# Altium footprint library Test.PcbLib: 245 footprints (part 16 of 17)
Each footprint in its own frame and in the unit in brackets; x right, y up, seen from the top. Pads: shape width x height; smd on the part's side, far side on the other; paste and mask are expansions set on the pad; w line width, h text height; cw(c..) or ccw(c..) is an arc to the next point about the centre after c.
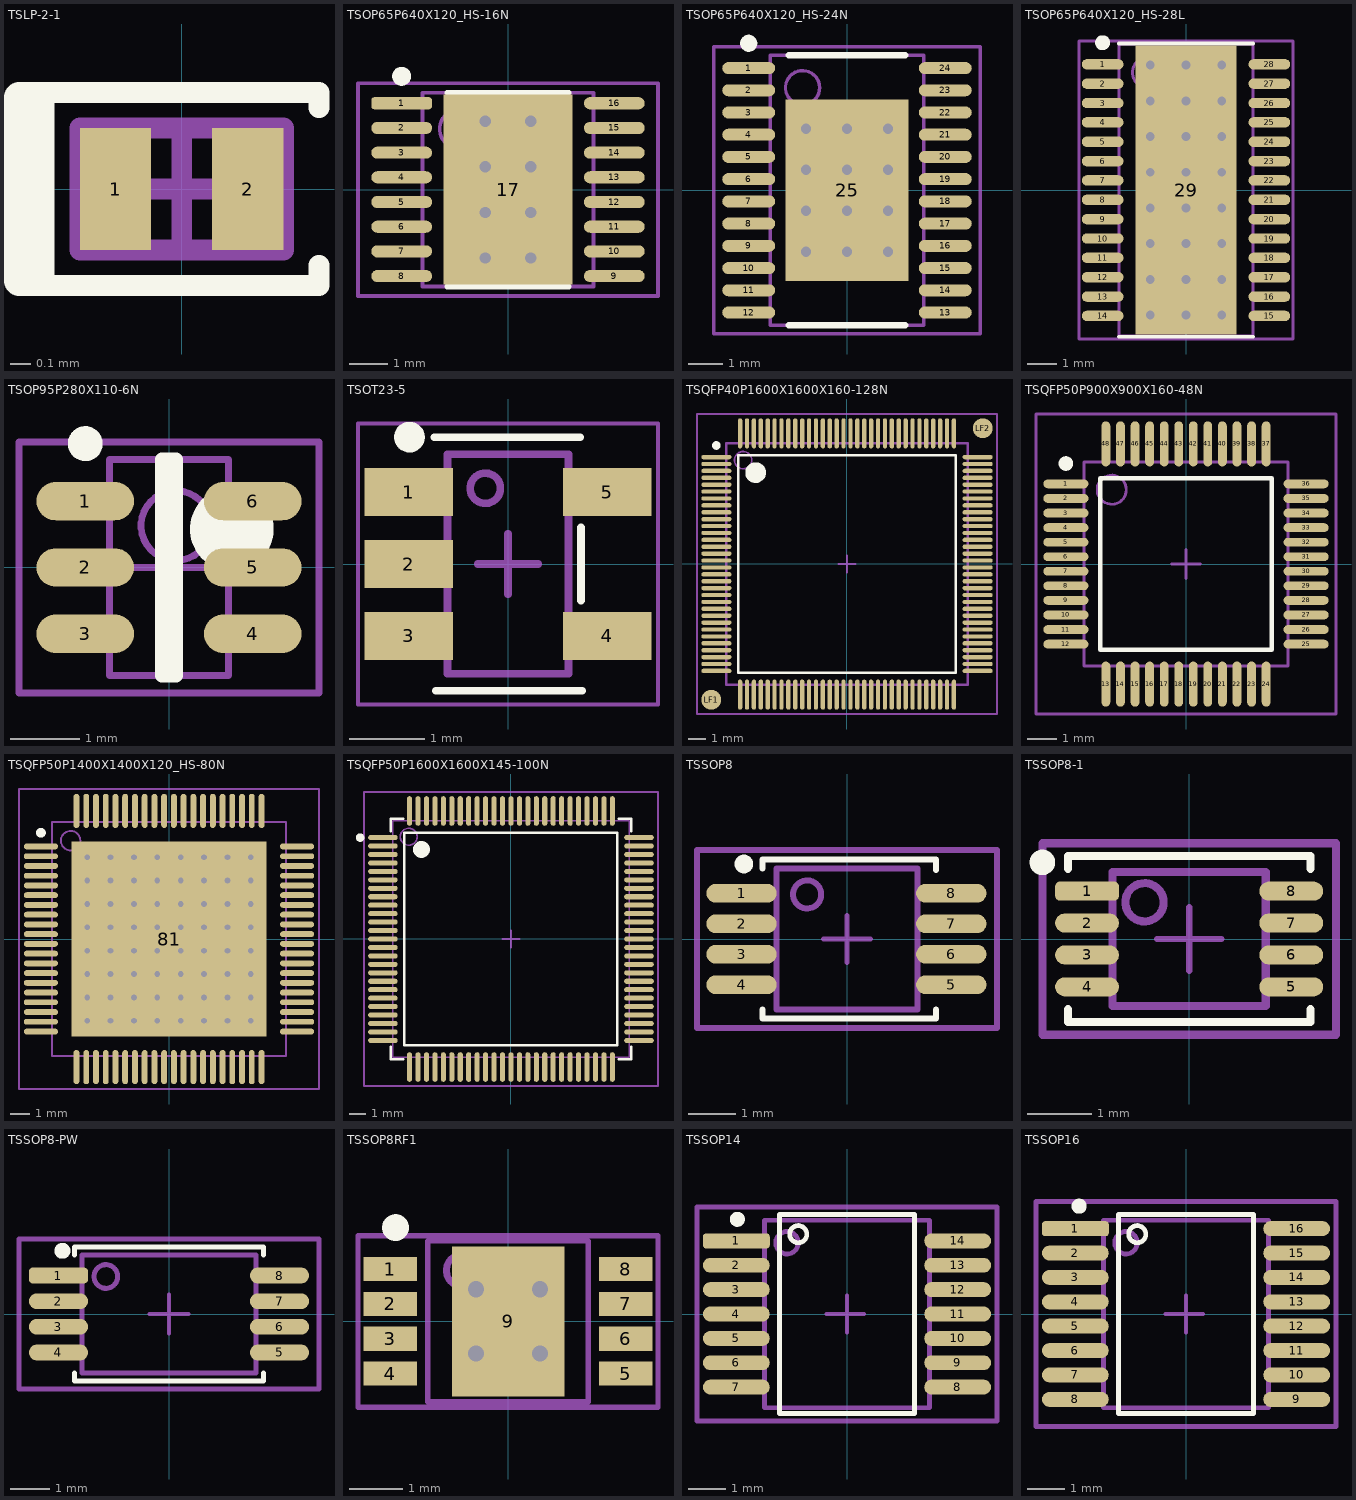
[diagram p15: the footprints below, top view; thin cyan lines are the x and y axes]

## TSLP-2-1 [mm] "TSLP-2-1 diode"
height 0.4
pads (2):
  rect 0.35x0.6 smd: 1(-0.325,0) 2(0.325,0)
Top Overlay:
  lines w0.102: -0.8,-0.475 -0.7,-0.475 0.675,-0.475 0.675,-0.375 ; -0.8,0.475 -0.7,0.475 0.675,0.475 0.675,0.4
  lines w0.15: -0.8,-0.45 -0.8,0.45 ; -0.7,-0.45 -0.7,0.45
Mechanical 13:
  lines w0.102: -0.5,-0.3 -0.5,0.3 ; -0.5,-0.3 -0.5,0.3 ; -0.5,-0.3 0.5,-0.3 0.5,0.3 -0.5,0.3
Mechanical 15:
  lines w0.102: -0.3,0 0.3,0 ; 0,-0.3 0,0.3
3D body: height 0.41, standoff 0.4, extent -0.525,-0.3 -0.325,0.3
3D body: height 0.4, standoff 0, extent -0.525,-0.3 0.5,0.3

## TSOP65P640X120_HS-16N [mm] "TSOP, 16-Leads, Body 5,1x4,5mm (max), Pitch 0,65mm, IPC Medium Density"
height 1.2
pads (17):
  rrect50% 1.6x0.32 smd mask+0.051: 1(-2.8,2.275)
  oval 1.6x0.32 smd mask+0.051: 2(-2.8,1.625) 3(-2.8,0.975) 4(-2.8,0.325) 5(-2.8,-0.325) 6(-2.8,-0.975) 7(-2.8,-1.625) 8(-2.8,-2.275) 9(2.8,-2.275) 10(2.8,-1.625) 11(2.8,-0.975) 12(2.8,-0.325) 13(2.8,0.325) 14(2.8,0.975) 15(2.8,1.625) 16(2.8,2.275)
  rect 3.4x5 smd paste-5 mask-5: 17(0,0)
via -0.6,0.6 diameter 0.65 hole 0.3
via 0.6,0.6 diameter 0.65 hole 0.3
via -0.6,-0.6 diameter 0.65 hole 0.3
via 0.6,-0.6 diameter 0.65 hole 0.3
via -0.6,-1.8 diameter 0.65 hole 0.3
via 0.6,-1.8 diameter 0.65 hole 0.3
via 0.6,1.8 diameter 0.65 hole 0.3
via -0.6,1.8 diameter 0.65 hole 0.3
Top Overlay:
  circle w0.25: c-2.8,2.985 r0.125
  lines w0.15: -1.6,-2.55 1.6,-2.55 ; -1.6,2.55 1.6,2.55
Top Paste:
  region: -0.925,-1.95 -0.75,-2.125 -0.75,-2.45 -1.65,-2.45 -1.65,-1.95
  region: 0.925,-1.95 0.75,-2.125 0.75,-2.45 1.65,-2.45 1.65,-1.95
  region: 0.925,1.95 0.75,2.125 0.75,2.45 1.65,2.45 1.65,1.95
  region: -0.45,-2.125 -0.275,-1.95 0.275,-1.95 0.45,-2.125 0.45,-2.45 -0.45,-2.45
  region: -0.45,2.125 -0.275,1.95 0.275,1.95 0.45,2.125 0.45,2.45 -0.45,2.45
  region: 0.925,1.65 0.75,1.475 0.75,0.925 0.925,0.75 1.65,0.75 1.65,1.65
  region: 0.925,0.45 0.75,0.275 0.75,-0.275 0.925,-0.45 1.65,-0.45 1.65,0.45
  region: 0.925,-0.75 0.75,-0.925 0.75,-1.475 0.925,-1.65 1.65,-1.65 1.65,-0.75
  region: -0.925,-0.75 -0.75,-0.925 -0.75,-1.475 -0.925,-1.65 -1.65,-1.65 -1.65,-0.75
  region: -0.925,0.45 -0.75,0.275 -0.75,-0.275 -0.925,-0.45 -1.65,-0.45 -1.65,0.45
  region: -0.45,-0.925 -0.275,-0.75 0.275,-0.75 0.45,-0.925 0.45,-1.475 0.275,-1.65 -0.275,-1.65 -0.45,-1.475
  region: -0.45,0.275 -0.275,0.45 0.275,0.45 0.45,0.275 0.45,-0.275 0.275,-0.45 -0.275,-0.45 -0.45,-0.275
  region: -0.45,1.475 -0.275,1.65 0.275,1.65 0.45,1.475 0.45,0.925 0.275,0.75 -0.275,0.75 -0.45,0.925
  region: -0.925,1.65 -0.75,1.475 -0.75,0.925 -0.925,0.75 -1.65,0.75 -1.65,1.65
  region: -0.925,1.95 -0.75,2.125 -0.75,2.45 -1.65,2.45 -1.65,1.95
Top Solder:
  drawing of 8 lines, arcs and shapes, not listed
Mechanical 13:
  circle w0.1: c-1.3,1.6 r0.5
  lines w0.1: -2.25,-2.55 -2.25,2.55 2.25,2.55 2.25,-2.55 -2.25,-2.55
Mechanical 15:
  lines w0.1: -0.5,0 0.5,0 ; 0,-0.5 0,0.5 ; -3.95,-2.8 -3.95,2.8 3.95,2.8 3.95,-2.8 -3.95,-2.8
3D body: height 1.2, standoff 0.05, extent -2.25,-2.55 2.25,2.55

## TSOP65P640X120_HS-24N [mm] "TSOP, 24-Leads, Body 7,9x4,5mm (max), Pitch 0,65mm, IPC Medium Density"
height 1.2
pads (25):
  oval 1.55x0.35 smd mask+0.051: 1(-2.875,3.575) 2(-2.875,2.925) 3(-2.875,2.275) 4(-2.875,1.625) 5(-2.875,0.975) 6(-2.875,0.325) 7(-2.875,-0.325) 8(-2.875,-0.975) 9(-2.875,-1.625) 10(-2.875,-2.275) 11(-2.875,-2.925) 12(-2.875,-3.575) 13(2.875,-3.575) 14(2.875,-2.925) 15(2.875,-2.275) 16(2.875,-1.625) 17(2.875,-0.975) 18(2.875,-0.325) 19(2.875,0.325) 20(2.875,0.975) 21(2.875,1.625) 22(2.875,2.275) 23(2.875,2.925) 24(2.875,3.575)
  rect 3.6x5.3 smd paste-7 mask-7: 25(0,0)
via -1.2,1.8 diameter 0.65 hole 0.3
via 0,1.8 diameter 0.65 hole 0.3
via 1.2,1.8 diameter 0.65 hole 0.3
via -1.2,0.6 diameter 0.65 hole 0.3
via 0,0.6 diameter 0.65 hole 0.3
via 1.2,0.6 diameter 0.65 hole 0.3
via -1.2,-0.6 diameter 0.65 hole 0.3
via 0,-0.6 diameter 0.65 hole 0.3
via 1.2,-0.6 diameter 0.65 hole 0.3
via -1.2,-1.8 diameter 0.65 hole 0.3
via 0,-1.8 diameter 0.65 hole 0.3
via 1.2,-1.8 diameter 0.65 hole 0.3
Top Overlay:
  circle w0.25: c-2.875,4.3 r0.125
  lines w0.2: -1.7,-3.95 1.7,-3.95 ; -1.7,3.95 1.7,3.95
Top Paste:
  region: -1.525,-1.95 -1.35,-2.125 -1.35,-2.625 -1.775,-2.625 -1.775,-1.95
  region: 1.525,-1.95 1.35,-2.125 1.35,-2.625 1.775,-2.625 1.775,-1.95
  region: 1.525,1.95 1.35,2.125 1.35,2.625 1.775,2.625 1.775,1.95
  region: -1.525,1.95 -1.35,2.125 -1.35,2.625 -1.775,2.625 -1.775,1.95
  region: -1.092,2.625 -1.092,2.159 -0.813,1.88 -0.406,1.88 -0.127,2.159 -0.127,2.625
  region: 0.108,2.625 0.108,2.159 0.387,1.88 0.794,1.88 1.073,2.159 1.073,2.625
  region: -1.092,-2.625 -1.092,-2.159 -0.813,-1.88 -0.406,-1.88 -0.127,-2.159 -0.127,-2.625
  region: 0.108,-2.625 0.108,-2.159 0.387,-1.88 0.794,-1.88 1.073,-2.159 1.073,-2.625
  region: 1.775,0.708 1.559,0.708 1.28,0.987 1.28,1.394 1.559,1.673 1.775,1.673
  region: 1.775,-0.492 1.559,-0.492 1.28,-0.213 1.28,0.194 1.559,0.473 1.775,0.473
  region: 1.775,-1.692 1.559,-1.692 1.28,-1.413 1.28,-1.006 1.559,-0.727 1.775,-0.727
  region: -1.775,-1.692 -1.559,-1.692 -1.28,-1.413 -1.28,-1.006 -1.559,-0.727 -1.775,-0.727
  region: -1.775,-0.492 -1.559,-0.492 -1.28,-0.213 -1.28,0.194 -1.559,0.473 -1.775,0.473
  region: -1.775,0.708 -1.559,0.708 -1.28,0.987 -1.28,1.394 -1.559,1.673 -1.775,1.673
  region: -1.067,1.448 -0.864,1.651 -0.356,1.651 -0.152,1.448 -0.152,0.94 -0.356,0.737 -0.838,0.737 -1.067,0.965
  region: 0.133,1.448 0.336,1.651 0.844,1.651 1.048,1.448 1.048,0.94 0.844,0.737 0.362,0.737 0.133,0.965
  region: 0.133,0.248 0.336,0.451 0.844,0.451 1.048,0.248 1.048,-0.26 0.844,-0.463 0.362,-0.463 0.133,-0.235
  region: 0.133,-0.952 0.336,-0.749 0.844,-0.749 1.048,-0.952 1.048,-1.46 0.844,-1.663 0.362,-1.663 0.133,-1.435
  region: -1.067,-0.952 -0.864,-0.749 -0.356,-0.749 -0.152,-0.952 -0.152,-1.46 -0.356,-1.663 -0.838,-1.663 -1.067,-1.435
  region: -1.067,0.248 -0.864,0.451 -0.356,0.451 -0.152,0.248 -0.152,-0.26 -0.356,-0.463 -0.838,-0.463 -1.067,-0.235
Top Solder:
  drawing of 24 lines, arcs and shapes, not listed
Mechanical 13:
  circle w0.1: c-1.3,3 r0.5
  lines w0.1: -2.25,-3.95 -2.25,3.95 2.25,3.95 2.25,-3.95 -2.25,-3.95
Mechanical 15:
  lines w0.1: -0.5,0 0.5,0 ; 0,-0.5 0,0.5 ; -3.9,-4.2 -3.9,4.2 3.9,4.2 3.9,-4.2 -3.9,-4.2
3D body: height 1.2, standoff 0.05, extent -2.25,-3.95 2.25,3.95
3D body: height 1.2, standoff 0, extent -1.803,2.515 -0.807,3.513

## TSOP65P640X120_HS-28L [mm] "TSOP, 28-Leads, Body 9,8x4,5mm, Pitch 0,65mm, IPC High Density"
height 1.2
pads (29):
  oval 1.4x0.35 smd mask+0.051: 1(-2.8,4.225) 2(-2.8,3.575) 3(-2.8,2.925) 4(-2.8,2.275) 5(-2.8,1.625) 6(-2.8,0.975) 7(-2.8,0.325) 8(-2.8,-0.325) 9(-2.8,-0.975) 10(-2.8,-1.625) 11(-2.8,-2.275) 12(-2.8,-2.925) 13(-2.8,-3.575) 14(-2.8,-4.225) 15(2.8,-4.225) 16(2.8,-3.575) 17(2.8,-2.925) 18(2.8,-2.275) 19(2.8,-1.625) 20(2.8,-0.975) 21(2.8,-0.325) 22(2.8,0.325) 23(2.8,0.975) 24(2.8,1.625) 25(2.8,2.275) 26(2.8,2.925) 27(2.8,3.575) 28(2.8,4.225)
  rect 3.4x9.7 smd paste-5 mask-5: 29(0,0)
via -1.2,4.2 diameter 0.65 hole 0.3
via 0,4.2 diameter 0.65 hole 0.3
via 1.2,4.2 diameter 0.65 hole 0.3
via -1.2,3 diameter 0.65 hole 0.3
via 0,3 diameter 0.65 hole 0.3
via 1.2,3 diameter 0.65 hole 0.3
via -1.2,1.8 diameter 0.65 hole 0.3
via 0,1.8 diameter 0.65 hole 0.3
via 1.2,1.8 diameter 0.65 hole 0.3
via -1.2,0.6 diameter 0.65 hole 0.3
via 0,0.6 diameter 0.65 hole 0.3
via 1.2,0.6 diameter 0.65 hole 0.3
via -1.2,-0.6 diameter 0.65 hole 0.3
via 0,-0.6 diameter 0.65 hole 0.3
via 1.2,-0.6 diameter 0.65 hole 0.3
via -1.2,-1.8 diameter 0.65 hole 0.3
via 0,-1.8 diameter 0.65 hole 0.3
via 1.2,-1.8 diameter 0.65 hole 0.3
via -1.2,-3 diameter 0.65 hole 0.3
via 0,-3 diameter 0.65 hole 0.3
via 1.2,-3 diameter 0.65 hole 0.3
via -1.2,-4.2 diameter 0.65 hole 0.3
via 0,-4.2 diameter 0.65 hole 0.3
via 1.2,-4.2 diameter 0.65 hole 0.3
Top Overlay:
  circle w0.25: c-2.8,4.95 r0.125
  lines w0.127: -2.25,-4.925 2.25,-4.925 ; -2.25,4.925 2.25,4.925
Top Paste:
  drawing of 36 lines, arcs and shapes, not listed
Top Solder:
  drawing of 24 lines, arcs and shapes, not listed
Mechanical 12:
  circle w0.4: c-1.2,4.2 r0.15
  circle w0.4: c-1.2,3 r0.15
  circle w0.4: c-1.2,1.8 r0.15
  circle w0.4: c-1.2,0.6 r0.15
  circle w0.4: c-1.2,-0.6 r0.15
  circle w0.4: c-1.2,-1.8 r0.15
  circle w0.4: c-1.2,-3 r0.15
  circle w0.4: c-1.2,-4.2 r0.15
  circle w0.4: c0,-4.2 r0.15
  circle w0.4: c1.2,-4.2 r0.15
  circle w0.4: c1.2,-3 r0.15
  circle w0.4: c1.2,-1.8 r0.15
  circle w0.4: c1.2,-0.6 r0.15
  circle w0.4: c1.2,0.6 r0.15
  circle w0.4: c1.2,1.8 r0.15
  circle w0.4: c1.2,3 r0.15
  circle w0.4: c1.2,4.2 r0.15
  circle w0.4: c0,4.2 r0.15
  circle w0.4: c0,3 r0.15
  circle w0.4: c0,1.8 r0.15
  circle w0.4: c0,0.6 r0.15
  circle w0.4: c0,-0.6 r0.15
  circle w0.4: c0,-1.8 r0.15
  circle w0.4: c0,-3 r0.15
Mechanical 13:
  circle w0.1: c-1.3,3.95 r0.5
  lines w0.1: -2.25,-4.9 -2.25,4.9 2.25,4.9 2.25,-4.9 -2.25,-4.9
Mechanical 15:
  lines w0.1: -0.5,0 0.5,0 ; 0,-0.5 0,0.5 ; -3.6,-5 -3.6,5 3.6,5 3.6,-5 -3.6,-5
3D body: height 1.2, standoff 0.1, extent -2.25,-4.9 2.25,4.9
3D body: height 1.21, standoff 1.2, extent -1.8,3.45 -0.804,4.448

## TSOP95P280X110-6N [mm] "TSOP, 6-Leads, Body 3,1x1,7mm (max), Pitch 0,95mm, IPC Medium Density"
height 1.1
pads (6):
  oval 1.4x0.55 smd mask+0.051: 1(-1.2,0.95) 2(-1.2,0) 3(-1.2,-0.95) 4(1.2,-0.95) 5(1.2,0) 6(1.2,0.95)
Top Overlay:
  circle w0.6: c0.9,0.55 r0.3
  circle w0.25: c-1.2,1.775 r0.125
  lines w0.2: -0.1,-1.55 0.1,-1.55 0.1,1.55 -0.1,1.55 -0.1,-1.55
Mechanical 13:
  circle w0.1: c0.1,0.6 r0.5
  lines w0.1: -0.85,-1.55 0.85,-1.55 0.85,1.55 -0.85,1.55 -0.85,-1.55
Mechanical 15:
  lines w0.1: -0.5,0 0.5,0 ; 0,-0.5 0,0.5 ; -2.15,-1.8 2.15,-1.8 2.15,1.8 -2.15,1.8 -2.15,-1.8
3D body: height 1.1, standoff 0.01, extent -0.85,-1.55 0.85,1.55

## TSOT23-5 [mm] "5-LEAD plastic"
height 0.85
pads (5):
  rect 1.168x0.635 smd mask+0.051: 1(-1.31,0.95) 2(-1.31,0) 3(-1.31,-0.95) 4(1.31,-0.95) 5(1.31,0.95)
Top Overlay:
  circle w0.203: c-1.302,1.675 r0.102
  lines w0.102: -0.975,1.675 0.955,1.675 ; -0.95,-1.675 0.98,-1.675 ; 0.965,-0.483 0.965,0.483
Mechanical 13:
  circle w0.1: c-0.3,1 r0.2
  lines w0.102: -0.8,-1.45 -0.8,1.45 0.8,1.45 0.8,-1.45 -0.8,-1.45
Mechanical 15:
  lines w0.051: -1.981,-1.854 -1.981,1.854 1.981,1.854 1.981,-1.854 -1.981,-1.854
  lines w0.102: -0.4,0 0.4,0 ; 0,-0.4 0,0.4
3D body: height 1.46, standoff 1.45, extent -0.504,0.796 -0.096,1.204
3D body: height 1.45, standoff 0, extent -0.8,-1.45 0.8,1.45
3D body: height 0.3, standoff 0, extent -1.275,0.725 -0.8,1.175
3D body: height 0.3, standoff 0, extent -1.288,-1.175 -0.812,-0.725
3D body: height 0.3, standoff 0, extent -1.275,-0.225 -0.8,0.225
3D body: height 0.3, standoff 0, extent 0.812,0.725 1.288,1.175
3D body: height 0.3, standoff 0, extent 0.812,-1.175 1.288,-0.725

## TSQFP40P1600X1600X160-128N [mm] "TSQFP, 128-Leads, Body 16,2x16,2mm (max), Pitch 0,40mm, IPC Medium Density"
height 1.6
pads (130):
  oval 1.75x0.25 smd mask+0.051: 1(-7.575,6.2) 2(-7.575,5.8) 3(-7.575,5.4) 4(-7.575,5) 5(-7.575,4.6) 6(-7.575,4.2) 7(-7.575,3.8) 8(-7.575,3.4) 9(-7.575,3) 10(-7.575,2.6) 11(-7.575,2.2) 12(-7.575,1.8) 13(-7.575,1.4) 14(-7.575,1) 15(-7.575,0.6) 16(-7.575,0.2) 17(-7.575,-0.2) 18(-7.575,-0.6) 19(-7.575,-1) 20(-7.575,-1.4) 21(-7.575,-1.8) 22(-7.575,-2.2) 23(-7.575,-2.6) 24(-7.575,-3) 25(-7.575,-3.4) 26(-7.575,-3.8) 27(-7.575,-4.2) 28(-7.575,-4.6) 29(-7.575,-5) 30(-7.575,-5.4) 31(-7.575,-5.8) 32(-7.575,-6.2) 65(7.575,-6.2) 66(7.575,-5.8) 67(7.575,-5.4) 68(7.575,-5) 69(7.575,-4.6) 70(7.575,-4.2) 71(7.575,-3.8) 72(7.575,-3.4) 73(7.575,-3) 74(7.575,-2.6) 75(7.575,-2.2) 76(7.575,-1.8) 77(7.575,-1.4) 78(7.575,-1) 79(7.575,-0.6) 80(7.575,-0.2) 81(7.575,0.2) 82(7.575,0.6) 83(7.575,1) 84(7.575,1.4) 85(7.575,1.8) 86(7.575,2.2) 87(7.575,2.6) 88(7.575,3) 89(7.575,3.4) 90(7.575,3.8) 91(7.575,4.2) 92(7.575,4.6) 93(7.575,5) 94(7.575,5.4) 95(7.575,5.8) 96(7.575,6.2)
  oval 0.25x1.75 smd mask+0.051: 33(-6.2,-7.575) 34(-5.8,-7.575) 35(-5.4,-7.575) 36(-5,-7.575) 37(-4.6,-7.575) 38(-4.2,-7.575) 39(-3.8,-7.575) 40(-3.4,-7.575) 41(-3,-7.575) 42(-2.6,-7.575) 43(-2.2,-7.575) 44(-1.8,-7.575) 45(-1.4,-7.575) 46(-1,-7.575) 47(-0.6,-7.575) 48(-0.2,-7.575) 49(0.2,-7.575) 50(0.6,-7.575) 51(1,-7.575) 52(1.4,-7.575) 53(1.8,-7.575) 54(2.2,-7.575) 55(2.6,-7.575) 56(3,-7.575) 57(3.4,-7.575) 58(3.8,-7.575) 59(4.2,-7.575) 60(4.6,-7.575) 61(5,-7.575) 62(5.4,-7.575) 63(5.8,-7.575) 64(6.2,-7.575) 97(6.2,7.575) 98(5.8,7.575) 99(5.4,7.575) 100(5,7.575) 101(4.6,7.575) 102(4.2,7.575) 103(3.8,7.575) 104(3.4,7.575) 105(3,7.575) 106(2.6,7.575) 107(2.2,7.575) 108(1.8,7.575) 109(1.4,7.575) 110(1,7.575) 111(0.6,7.575) 112(0.2,7.575) 113(-0.2,7.575) 114(-0.6,7.575) 115(-1,7.575) 116(-1.4,7.575) 117(-1.8,7.575) 118(-2.2,7.575) 119(-2.6,7.575) 120(-3,7.575) 121(-3.4,7.575) 122(-3.8,7.575) 123(-4.2,7.575) 124(-4.6,7.575) 125(-5,7.575) 126(-5.4,7.575) 127(-5.8,7.575) 128(-6.2,7.575)
  round 1.143 smd paste-1.27 mask+0.635: LF1(-7.874,-7.874) LF2(7.874,7.874)
Top Overlay:
  circle w0.25: c-7.575,6.875 r0.125
  circle w0.6: c-5.3,5.3 r0.3
  lines w0.15: -6.3,-6.3 -6.3,6.3 6.3,6.3 6.3,-6.3 -6.3,-6.3
Mechanical 13:
  circle w0.1: c-6.023,6.023 r0.5
  lines w0.127: -7,-7 -7,7 7,7 7,-7 -7,-7
Mechanical 15:
  lines w0.127: -0.5,0 0.5,0 ; 0,-0.5 0,0.5 ; -8.7,-8.7 -8.7,8.7 8.7,8.7 8.7,-8.7 -8.7,-8.7
3D body: height 1.6, standoff 0.1, extent -7,-7 7,7

## TSQFP50P900X900X160-48N [mm] "TSQFP, 48-Leads, Body 9,0x9,0mm (max), Pitch 0,50mm, IPC Medium Density"
height 1.6
pads (48):
  oval 1.55x0.3 smd mask+0.038: 1(-4.125,2.75) 2(-4.125,2.25) 3(-4.125,1.75) 4(-4.125,1.25) 5(-4.125,0.75) 6(-4.125,0.25) 7(-4.125,-0.25) 8(-4.125,-0.75) 9(-4.125,-1.25) 10(-4.125,-1.75) 11(-4.125,-2.25) 12(-4.125,-2.75) 25(4.125,-2.75) 26(4.125,-2.25) 27(4.125,-1.75) 28(4.125,-1.25) 29(4.125,-0.75) 30(4.125,-0.25) 31(4.125,0.25) 32(4.125,0.75) 33(4.125,1.25) 34(4.125,1.75) 35(4.125,2.25) 36(4.125,2.75)
  oval 0.3x1.55 smd mask+0.038: 13(-2.75,-4.125) 14(-2.25,-4.125) 15(-1.75,-4.125) 16(-1.25,-4.125) 17(-0.75,-4.125) 18(-0.25,-4.125) 19(0.25,-4.125) 20(0.75,-4.125) 21(1.25,-4.125) 22(1.75,-4.125) 23(2.25,-4.125) 24(2.75,-4.125) 37(2.75,4.125) 38(2.25,4.125) 39(1.75,4.125) 40(1.25,4.125) 41(0.75,4.125) 42(0.25,4.125) 43(-0.25,4.125) 44(-0.75,4.125) 45(-1.25,4.125) 46(-1.75,4.125) 47(-2.25,4.125) 48(-2.75,4.125)
Top Overlay:
  circle w0.25: c-4.125,3.45 r0.125
  lines w0.15: -2.95,-2.95 2.95,-2.95 2.95,2.95 -2.95,2.95 -2.95,-2.95
Mechanical 13:
  circle w0.1: c-2.55,2.55 r0.5
  lines w0.1: -3.5,-3.5 3.5,-3.5 3.5,3.5 -3.5,3.5 -3.5,-3.5
Mechanical 15:
  lines w0.1: -0.5,0 0.5,0 ; 0,-0.5 0,0.5 ; -5.15,-5.15 5.15,-5.15 5.15,5.15 -5.15,5.15 -5.15,-5.15
3D body: height 1.6, standoff 0.15, extent -3.5,-3.5 3.5,3.5
3D body: height 1.61, standoff 1.6, extent -2.928,2.152 -2.152,2.928

## TSQFP50P1400X1400X120_HS-80N [mm] "TSQFP, 80-Leads, Body 14x14mm, Pitch 0,50mm, IPC Medium Density"
height 1.2
pads (81):
  oval 1.75x0.3 smd mask+0.051: 1(-6.575,4.75) 2(-6.575,4.25) 3(-6.575,3.75) 4(-6.575,3.25) 5(-6.575,2.75) 6(-6.575,2.25) 7(-6.575,1.75) 8(-6.575,1.25) 9(-6.575,0.75) 10(-6.575,0.25) 11(-6.575,-0.25) 12(-6.575,-0.75) 13(-6.575,-1.25) 14(-6.575,-1.75) 15(-6.575,-2.25) 16(-6.575,-2.75) 17(-6.575,-3.25) 18(-6.575,-3.75) 19(-6.575,-4.25) 20(-6.575,-4.75) 41(6.575,-4.75) 42(6.575,-4.25) 43(6.575,-3.75) 44(6.575,-3.25) 45(6.575,-2.75) 46(6.575,-2.25) 47(6.575,-1.75) 48(6.575,-1.25) 49(6.575,-0.75) 50(6.575,-0.25) 51(6.575,0.25) 52(6.575,0.75) 53(6.575,1.25) 54(6.575,1.75) 55(6.575,2.25) 56(6.575,2.75) 57(6.575,3.25) 58(6.575,3.75) 59(6.575,4.25) 60(6.575,4.75)
  oval 0.3x1.75 smd mask+0.051: 21(-4.75,-6.575) 22(-4.25,-6.575) 23(-3.75,-6.575) 24(-3.25,-6.575) 25(-2.75,-6.575) 26(-2.25,-6.575) 27(-1.75,-6.575) 28(-1.25,-6.575) 29(-0.75,-6.575) 30(-0.25,-6.575) 31(0.25,-6.575) 32(0.75,-6.575) 33(1.25,-6.575) 34(1.75,-6.575) 35(2.25,-6.575) 36(2.75,-6.575) 37(3.25,-6.575) 38(3.75,-6.575) 39(4.25,-6.575) 40(4.75,-6.575) 61(4.75,6.575) 62(4.25,6.575) 63(3.75,6.575) 64(3.25,6.575) 65(2.75,6.575) 66(2.25,6.575) 67(1.75,6.575) 68(1.25,6.575) 69(0.75,6.575) 70(0.25,6.575) 71(-0.25,6.575) 72(-0.75,6.575) 73(-1.25,6.575) 74(-1.75,6.575) 75(-2.25,6.575) 76(-2.75,6.575) 77(-3.25,6.575) 78(-3.75,6.575) 79(-4.25,6.575) 80(-4.75,6.575)
  rect 10x10 smd paste-10 mask-10: 81(0,0)
via -0.6,-0.6 diameter 0.65 hole 0.3
via -0.6,0.6 diameter 0.65 hole 0.3
via -0.6,1.8 diameter 0.65 hole 0.3
via -0.6,3 diameter 0.65 hole 0.3
via -0.6,4.2 diameter 0.65 hole 0.3
via -0.6,-1.8 diameter 0.65 hole 0.3
via -0.6,-3 diameter 0.65 hole 0.3
via -0.6,-4.2 diameter 0.65 hole 0.3
via 0.6,-4.2 diameter 0.65 hole 0.3
via 0.6,-3 diameter 0.65 hole 0.3
via 0.6,-1.8 diameter 0.65 hole 0.3
via 0.6,4.2 diameter 0.65 hole 0.3
via 0.6,3 diameter 0.65 hole 0.3
via 0.6,1.8 diameter 0.65 hole 0.3
via 0.6,0.6 diameter 0.65 hole 0.3
via 0.6,-0.6 diameter 0.65 hole 0.3
via -1.8,-4.2 diameter 0.65 hole 0.3
via -1.8,-3 diameter 0.65 hole 0.3
via -1.8,-1.8 diameter 0.65 hole 0.3
via -1.8,4.2 diameter 0.65 hole 0.3
via -1.8,3 diameter 0.65 hole 0.3
via -1.8,1.8 diameter 0.65 hole 0.3
via -1.8,0.6 diameter 0.65 hole 0.3
via -1.8,-0.6 diameter 0.65 hole 0.3
via -3,-4.2 diameter 0.65 hole 0.3
via -3,-3 diameter 0.65 hole 0.3
via -3,-1.8 diameter 0.65 hole 0.3
via -3,4.2 diameter 0.65 hole 0.3
via -3,3 diameter 0.65 hole 0.3
via -3,1.8 diameter 0.65 hole 0.3
via -3,0.6 diameter 0.65 hole 0.3
via -3,-0.6 diameter 0.65 hole 0.3
via -4.2,-4.2 diameter 0.65 hole 0.3
via -4.2,-3 diameter 0.65 hole 0.3
via -4.2,-1.8 diameter 0.65 hole 0.3
via -4.2,4.2 diameter 0.65 hole 0.3
via -4.2,3 diameter 0.65 hole 0.3
via -4.2,1.8 diameter 0.65 hole 0.3
via -4.2,0.6 diameter 0.65 hole 0.3
via -4.2,-0.6 diameter 0.65 hole 0.3
via 1.8,-4.2 diameter 0.65 hole 0.3
via 1.8,-3 diameter 0.65 hole 0.3
via 1.8,-1.8 diameter 0.65 hole 0.3
via 1.8,4.2 diameter 0.65 hole 0.3
via 1.8,3 diameter 0.65 hole 0.3
via 1.8,1.8 diameter 0.65 hole 0.3
via 1.8,0.6 diameter 0.65 hole 0.3
via 1.8,-0.6 diameter 0.65 hole 0.3
via 3,-4.2 diameter 0.65 hole 0.3
via 3,-3 diameter 0.65 hole 0.3
via 3,-1.8 diameter 0.65 hole 0.3
via 3,4.2 diameter 0.65 hole 0.3
via 3,3 diameter 0.65 hole 0.3
via 3,1.8 diameter 0.65 hole 0.3
via 3,0.6 diameter 0.65 hole 0.3
via 3,-0.6 diameter 0.65 hole 0.3
via 4.2,-4.2 diameter 0.65 hole 0.3
via 4.2,-3 diameter 0.65 hole 0.3
via 4.2,-1.8 diameter 0.65 hole 0.3
via 4.2,4.2 diameter 0.65 hole 0.3
via 4.2,3 diameter 0.65 hole 0.3
via 4.2,1.8 diameter 0.65 hole 0.3
via 4.2,0.6 diameter 0.65 hole 0.3
via 4.2,-0.6 diameter 0.65 hole 0.3
Top Overlay:
  circle w0.25: c-6.575,5.45 r0.125
Top Paste:
  drawing of 81 lines, arcs and shapes, not listed
Top Solder:
  drawing of 64 lines, arcs and shapes, not listed
Mechanical 13:
  circle w0.1: c-5.05,5.05 r0.5
  lines w0.1: -6,-6 6,-6 6,6 -6,6 -6,-6
Mechanical 15:
  lines w0.1: -0.5,0 0.5,0 ; 0,-0.5 0,0.5 ; -7.7,-7.7 7.7,-7.7 7.7,7.7 -7.7,7.7 -7.7,-7.7
3D body: height 1.2, standoff 0.1, extent -6,-6 6,6

## TSQFP50P1600X1600X145-100N [mm] "TSQFP, 100-Leads, Body 16,2x16,2mm (max), Pitch 0,50mm, IPC Medium Density"
height 1.45
pads (100):
  oval 1.75x0.3 smd mask+0.03: 1(-7.575,6) 2(-7.575,5.5) 3(-7.575,5) 4(-7.575,4.5) 5(-7.575,4) 6(-7.575,3.5) 7(-7.575,3) 8(-7.575,2.5) 9(-7.575,2) 10(-7.575,1.5) 11(-7.575,1) 12(-7.575,0.5) 13(-7.575,0) 14(-7.575,-0.5) 15(-7.575,-1) 16(-7.575,-1.5) 17(-7.575,-2) 18(-7.575,-2.5) 19(-7.575,-3) 20(-7.575,-3.5) 21(-7.575,-4) 22(-7.575,-4.5) 23(-7.575,-5) 24(-7.575,-5.5) 25(-7.575,-6) 51(7.575,-6) 52(7.575,-5.5) 53(7.575,-5) 54(7.575,-4.5) 55(7.575,-4) 56(7.575,-3.5) 57(7.575,-3) 58(7.575,-2.5) 59(7.575,-2) 60(7.575,-1.5) 61(7.575,-1) 62(7.575,-0.5) 63(7.575,0) 64(7.575,0.5) 65(7.575,1) 66(7.575,1.5) 67(7.575,2) 68(7.575,2.5) 69(7.575,3) 70(7.575,3.5) 71(7.575,4) 72(7.575,4.5) 73(7.575,5) 74(7.575,5.5) 75(7.575,6)
  oval 0.3x1.75 smd mask+0.03: 26(-6,-7.575) 27(-5.5,-7.575) 28(-5,-7.575) 29(-4.5,-7.575) 30(-4,-7.575) 31(-3.5,-7.575) 32(-3,-7.575) 33(-2.5,-7.575) 34(-2,-7.575) 35(-1.5,-7.575) 36(-1,-7.575) 37(-0.5,-7.575) 38(0,-7.575) 39(0.5,-7.575) 40(1,-7.575) 41(1.5,-7.575) 42(2,-7.575) 43(2.5,-7.575) 44(3,-7.575) 45(3.5,-7.575) 46(4,-7.575) 47(4.5,-7.575) 48(5,-7.575) 49(5.5,-7.575) 50(6,-7.575) 76(6,7.575) 77(5.5,7.575) 78(5,7.575) 79(4.5,7.575) 80(4,7.575) 81(3.5,7.575) 82(3,7.575) 83(2.5,7.575) 84(2,7.575) 85(1.5,7.575) 86(1,7.575) 87(0.5,7.575) 88(0,7.575) 89(-0.5,7.575) 90(-1,7.575) 91(-1.5,7.575) 92(-2,7.575) 93(-2.5,7.575) 94(-3,7.575) 95(-3.5,7.575) 96(-4,7.575) 97(-4.5,7.575) 98(-5,7.575) 99(-5.5,7.575) 100(-6,7.575)
Top Overlay:
  circle w0.5: c-5.3,5.3 r0.25
  circle w0.25: c-8.925,6 r0.125
  lines w0.15: -7.125,-6.375 -7.125,-7.125 -6.375,-7.125 ; -7.125,6.375 -7.125,7.125 -6.375,7.125 ; 6.375,-7.125 7.125,-7.125 7.125,-6.375 ; 6.375,7.125 7.125,7.125 7.125,6.375 ; -6.3,-6.3 6.3,-6.3 6.3,6.3 -6.3,6.3 -6.3,-6.3
Mechanical 13:
  circle w0.1: c-6.05,6.05 r0.5
  lines w0.1: -7,-7 7,-7 7,7 -7,7 -7,-7
Mechanical 15:
  lines w0.1: -0.5,0 0.5,0 ; 0,-0.5 0,0.5 ; -8.7,-8.7 8.7,-8.7 8.7,8.7 -8.7,8.7 -8.7,-8.7
3D body: height 1.45, standoff 0.08, extent -7,-7 7,7
3D body: height 1.46, standoff 1, extent -6.56,5.54 -5.54,6.56

## TSSOP8 [mm] "TSSOP8 3x3mm R0.65mm"
height 0.95
pads (8):
  oval 1.5x0.4 smd mask+0.038: 1(-2.25,0.975) 2(-2.25,0.325) 3(-2.25,-0.325) 4(-2.25,-0.975) 5(2.225,-0.975) 6(2.225,-0.325) 7(2.225,0.325) 8(2.225,0.975)
Top Overlay:
  circle w0.2: c-2.2,1.6 r0.1
  lines w0.127: -1.8,-1.5 -1.8,-1.7 1.9,-1.7 1.9,-1.5 ; -1.8,1.5 -1.8,1.7 1.9,1.7 1.9,1.475
Mechanical 13:
  circle w0.127: c-0.85,0.95 r0.3
  lines w0.127: -1.5,-1.5 1.5,-1.5 1.5,1.5 -1.5,1.5 -1.5,-1.5
Mechanical 15:
  lines w0.102: -0.5,0 0.5,0 ; 0,-0.5 0,0.5
  lines w0.127: -3.2,-1.9 -3.2,1.9 3.2,1.9 3.2,-1.9 -3.2,-1.9
3D body: height 0.96, standoff 0.95, extent -1.156,0.644 -0.544,1.256
3D body: height 0.95, standoff 0, extent -1.5,-1.5 1.5,1.5

## TSSOP8-1 [mm] "TSSOP8 3x3mm R0.5mm"
height 0.95
pads (8):
  rrect50% 1x0.3 smd mask+0.051: 1(-1.6,0.75)
  oval 1x0.3 smd mask+0.051: 2(-1.6,0.25) 3(-1.6,-0.25) 4(-1.6,-0.75) 5(1.6,-0.75) 6(1.6,-0.25) 7(1.6,0.25) 8(1.6,0.75)
Top Overlay:
  circle w0.2: c-2.3,1.2 r0.1
  lines w0.127: -1.9,-1.1 -1.9,-1.3 1.9,-1.3 1.9,-1.1 ; -1.9,1.1 -1.9,1.3 1.9,1.3 1.9,1.1
Mechanical 13:
  circle w0.127: c-0.7,0.575 r0.3
  lines w0.127: -1.2,-1.05 -1.2,1.05 1.2,1.05 1.2,-1.05 -1.2,-1.05
Mechanical 15:
  lines w0.102: -0.5,0 0.5,0 ; 0,-0.5 0,0.5
  lines w0.127: -2.3,-1.5 2.3,-1.5 2.3,1.5 -2.3,1.5 -2.3,-1.5
3D body: height 0.95, standoff 0, extent -1.2,-1.05 1.2,1.05
3D body: height 0.96, standoff 0.95, extent -1.006,0.269 -0.394,0.881

## TSSOP8-PW [mm] "TSSOP8 3x3mm R0.65mm"
height 0.95
pads (8):
  rrect50% 1.5x0.4 smd mask+0.038: 1(-2.8,0.975)
  oval 1.5x0.4 smd mask+0.038: 2(-2.8,0.325) 3(-2.8,-0.325) 4(-2.8,-0.975) 5(2.8,-0.975) 6(2.8,-0.325) 7(2.8,0.325) 8(2.8,0.975)
Top Overlay:
  circle w0.2: c-2.7,1.6 r0.1
  lines w0.127: -2.4,-1.5 -2.4,-1.7 2.4,-1.7 2.4,-1.5 ; -2.4,1.5 -2.4,1.7 2.4,1.7 2.4,1.5
Mechanical 13:
  circle w0.127: c-1.6,0.95 r0.3
  lines w0.127: -2.2,-1.5 2.2,-1.5 2.2,1.5 -2.2,1.5 -2.2,-1.5
Mechanical 15:
  lines w0.102: -0.5,0 0.5,0 ; 0,-0.5 0,0.5
  lines w0.127: -3.8,-1.9 -3.8,1.9 3.8,1.9 3.8,-1.9 -3.8,-1.9
3D body: height 0.96, standoff 0.95, extent -1.906,0.644 -1.294,1.256
3D body: height 0.95, standoff 0, extent -2.2,-1.5 2.2,1.5

## TSSOP8RF1 [mm] "TSOP, 8pin 3,0x3,0mm, R0,65mm, High Density NO EP"
height 1.092
pads (9):
  rect 1x0.45 smd mask+0.051: 1(-2.2,0.975) 2(-2.2,0.325) 3(-2.2,-0.325) 4(-2.2,-0.975) 5(2.2,-0.975) 6(2.2,-0.325) 7(2.2,0.325) 8(2.2,0.975)
  rect 2.1x2.8 smd paste-5 mask-5: 9(0,0)
via 0.6,-0.6 diameter 0.65 hole 0.3
via -0.6,-0.6 diameter 0.65 hole 0.3
via 0.6,0.6 diameter 0.65 hole 0.3
via -0.6,0.6 diameter 0.65 hole 0.3
Top Overlay:
  circle w0.25: c-2.1,1.75 r0.125
Top Paste:
  region: -1.025,1.375 1.025,1.375 1.025,0.75 0.925,0.75 0.725,0.95 0.475,0.95 0.275,0.75 -0.275,0.75 -0.475,0.95 -0.725,0.95 -0.925,0.75 -1.025,0.75
  region: -1.025,-1.375 1.025,-1.375 1.025,-0.75 0.925,-0.75 0.725,-0.95 0.475,-0.95 0.275,-0.75 -0.275,-0.75 -0.475,-0.95 -0.725,-0.95 -0.925,-0.75 -1.025,-0.75
  region: -0.45,0.275 -0.275,0.45 0.275,0.45 0.45,0.275 0.45,-0.275 0.275,-0.45 -0.275,-0.45 -0.45,-0.275
  region: -0.925,-0.45 -0.75,-0.275 -0.75,0.275 -0.925,0.45 -1.025,0.45 -1.025,-0.45
  region: 0.925,-0.45 0.75,-0.275 0.75,0.275 0.925,0.45 1.025,0.45 1.025,-0.45
Top Solder:
  region: -1.1,1.45 -0.6,1.45 -0.6,0.931 -0.727,0.906 -0.834,0.834 -0.906,0.727 -0.931,0.6 -0.906,0.473 -0.834,0.366 -0.727,0.294 -0.6,0.269 -0.6,0.275 -0.6,0.269 -0.473,0.294 -0.366,0.366 -0.294,0.473 -0.269,0.6 -0.275,0.6 -0.269,0.6 -0.294,0.727 -0.366,0.834 -0.473,0.906 -0.6,0.931 -0.6,0.925 -0.6,1.45 0,1.45 0,0 -1.1,0
  region: 1.1,1.45 0.6,1.45 0.6,0.931 0.727,0.906 0.834,0.834 0.906,0.727 0.931,0.6 0.906,0.473 0.834,0.366 0.727,0.294 0.6,0.269 0.6,0.275 0.6,0.269 0.473,0.294 0.366,0.366 0.294,0.473 0.269,0.6 0.275,0.6 0.269,0.6 0.294,0.727 0.366,0.834 0.473,0.906 0.6,0.931 0.6,0.925 0.6,1.45 0,1.45 0,0 1.1,0
  region: 1.1,-1.45 0.6,-1.45 0.6,-0.931 0.727,-0.906 0.834,-0.834 0.906,-0.727 0.931,-0.6 0.906,-0.473 0.834,-0.366 0.727,-0.294 0.6,-0.269 0.6,-0.275 0.6,-0.269 0.473,-0.294 0.366,-0.366 0.294,-0.473 0.269,-0.6 0.275,-0.6 0.269,-0.6 0.294,-0.727 0.366,-0.834 0.473,-0.906 0.6,-0.931 0.6,-0.925 0.6,-1.45 0,-1.45 0,0 1.1,0
  region: -1.1,-1.45 -0.6,-1.45 -0.6,-0.931 -0.727,-0.906 -0.834,-0.834 -0.906,-0.727 -0.931,-0.6 -0.906,-0.473 -0.834,-0.366 -0.727,-0.294 -0.6,-0.269 -0.6,-0.275 -0.6,-0.269 -0.473,-0.294 -0.366,-0.366 -0.294,-0.473 -0.269,-0.6 -0.275,-0.6 -0.269,-0.6 -0.294,-0.727 -0.366,-0.834 -0.473,-0.906 -0.6,-0.931 -0.6,-0.925 -0.6,-1.45 0,-1.45 0,0 -1.1,0
Mechanical 13:
  circle w0.127: c-0.85,0.95 r0.3
  lines w0.1: -1.5,-1.5 1.5,-1.5 1.5,1.5 -1.5,1.5 -1.5,-1.5
Mechanical 15:
  lines w0.1: -0.5,0 0.5,0 ; 0,-0.5 0,0.5 ; -2.8,-1.6 2.8,-1.6 2.8,1.6 -2.8,1.6 -2.8,-1.6
3D body: height 1.12, standoff 1.09, extent -1.156,0.644 -0.544,1.256
3D body: height 1.09, standoff 0.1, extent -1.5,-1.5 1.5,1.5

## TSSOP14 [mm] "TSSOP14 5x4.4mm R0.65mm"
height 1.1
pads (14):
  rrect40% 1.78x0.4 smd mask+0.038: 1(-2.95,1.95)
  oval 1.78x0.4 smd mask+0.038: 2(-2.95,1.3) 3(-2.95,0.65) 4(-2.95,0) 5(-2.95,-0.65) 6(-2.95,-1.3) 7(-2.95,-1.95) 8(2.95,-1.95) 9(2.95,-1.3) 10(2.95,-0.65) 11(2.95,0) 12(2.95,0.65) 13(2.95,1.3) 14(2.95,1.95)
Top Overlay:
  circle w0.2: c-2.925,2.525 r0.1
  circle w0.127: c-1.3,2.129 r0.229
  lines w0.127: -1.8,-2.65 1.8,-2.65 1.8,2.65 -1.8,2.65 -1.8,-2.65
Mechanical 13:
  circle w0.127: c-1.6,1.9 r0.3
  lines w0.127: 2.2,-2.5 -2.2,-2.5 -2.2,2.5 2.2,2.5 ; 2.2,-2.5 2.2,2.5 ; 2.2,-2.5 2.2,2.5
Mechanical 15:
  lines w0.102: -0.55,0 0.45,0 ; 0,-0.5 0,0.5
  lines w0.127: -4,-2.85 4,-2.85 4,2.85 -4,2.85 -4,-2.85
3D body: height 1.1, standoff 0.2, extent -2.2,-2.5 2.2,2.5
3D body: height 1.11, standoff 1.1, extent -1.911,1.594 -1.294,2.216

## TSSOP16 [mm] "TSSOP16 5x4.4mm R0.65mm"
height 1.1
pads (16):
  rrect40% 1.78x0.4 smd mask+0.051: 1(-2.95,2.275)
  oval 1.78x0.4 smd mask+0.051: 2(-2.95,1.625) 3(-2.95,0.975) 4(-2.95,0.325) 5(-2.95,-0.325) 6(-2.95,-0.975) 7(-2.95,-1.625) 8(-2.95,-2.275) 9(2.95,-2.275) 10(2.95,-1.625) 11(2.95,-0.975) 12(2.95,-0.325) 13(2.95,0.325) 14(2.95,0.975) 15(2.95,1.625) 16(2.95,2.275)
Top Overlay:
  circle w0.2: c-2.85,2.875 r0.1
  circle w0.127: c-1.3,2.129 r0.229
  lines w0.127: -1.8,-2.65 1.8,-2.65 1.8,2.65 -1.8,2.65 -1.8,-2.65
Mechanical 13:
  circle w0.127: c-1.6,1.9 r0.3
  lines w0.127: 2.2,-2.5 -2.2,-2.5 -2.2,2.5 2.2,2.5 ; 2.2,-2.5 2.2,2.5 ; 2.2,-2.5 2.2,2.5
Mechanical 15:
  lines w0.102: -0.55,0 0.45,0 ; 0,-0.5 0,0.5
  lines w0.127: -4,-3 4,-3 4,3 -4,3 -4,-3
3D body: height 1.1, standoff 0.2, extent -2.2,-2.5 2.2,2.5
3D body: height 1.11, standoff 1.1, extent -1.911,1.594 -1.294,2.216